# Altium footprint library Elettronica FM.PcbLib: 387 footprints (part 7 of 25)
Each footprint in its own frame and in the unit in brackets; x right, y up, seen from the top. Pads: shape width x height; smd on the part's side, far side on the other; paste and mask are expansions set on the pad; w line width, h text height; cw(c..) or ccw(c..) is an arc to the next point about the centre after c.
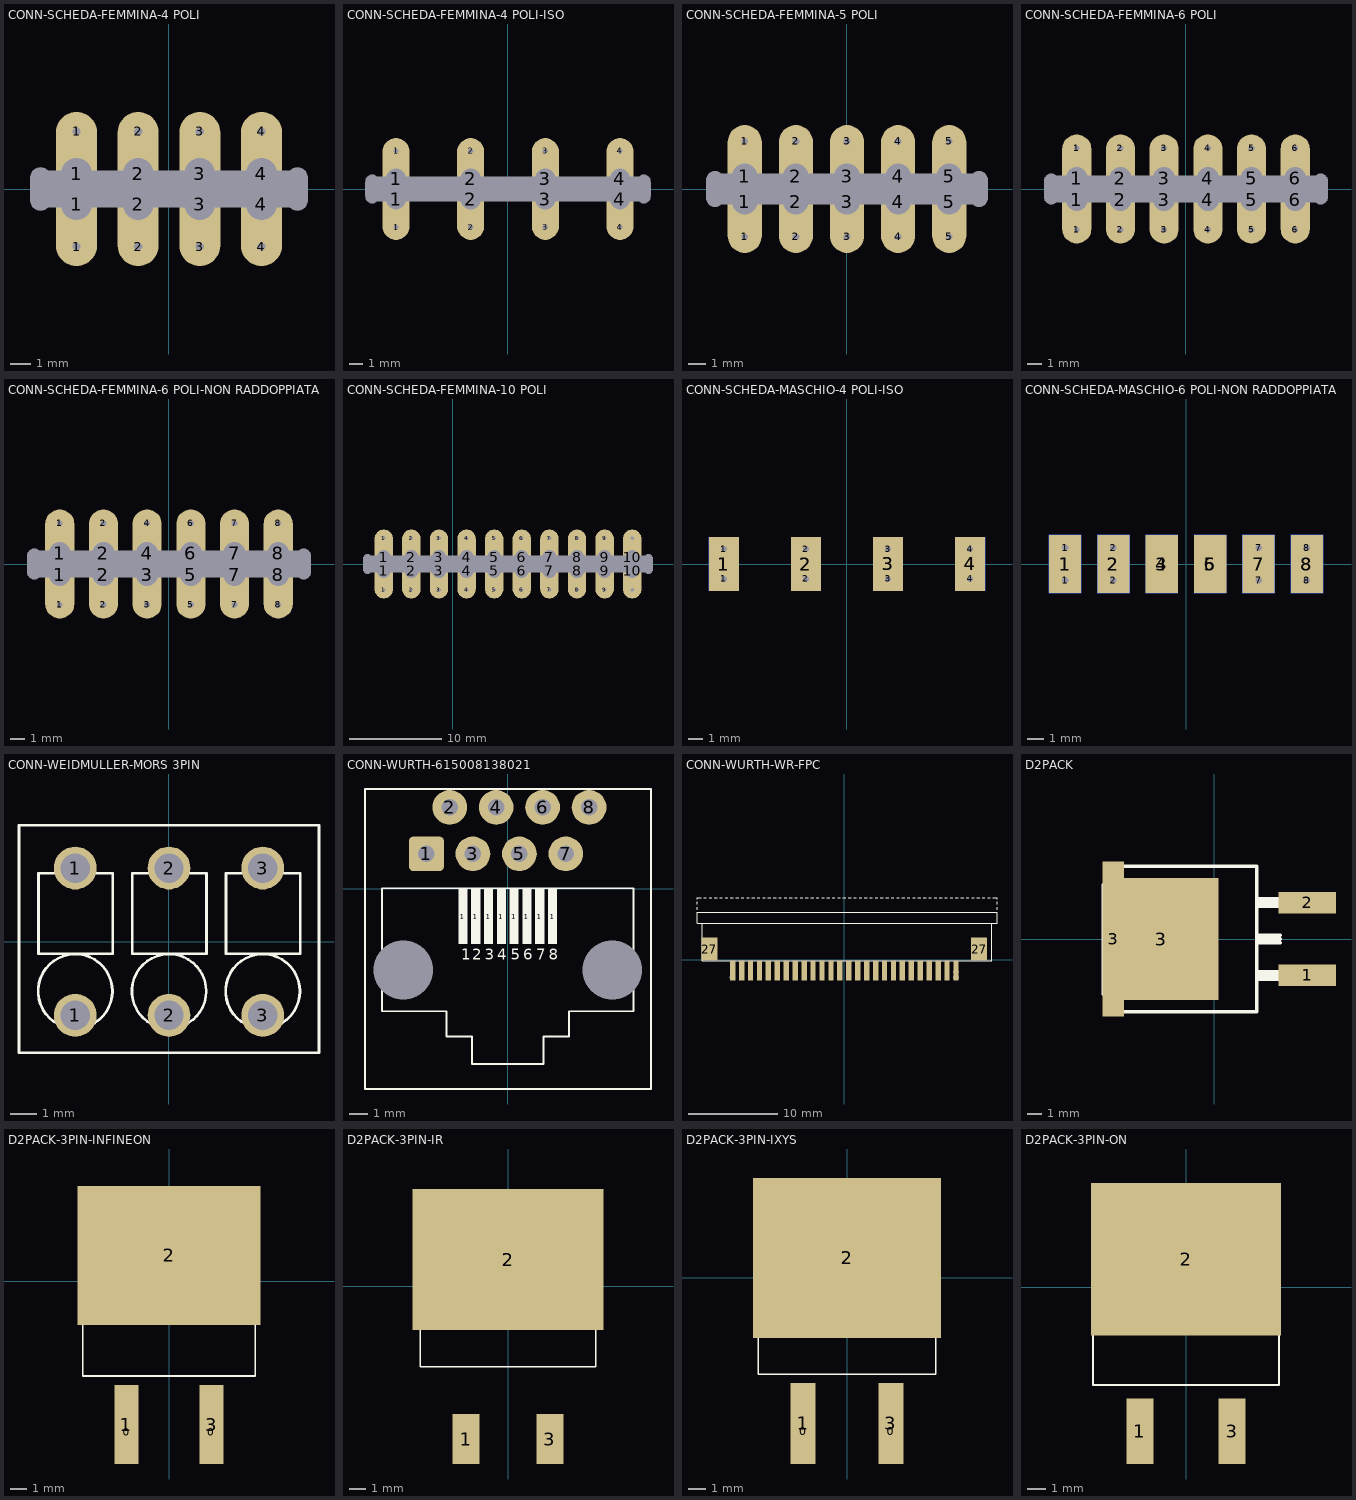
[diagram p6: the footprints below, top view; thin cyan lines are the x and y axes]

## CONN-SCHEDA-FEMMINA-4 POLI [mm]
height 14.2
pads (28):
  round 0 hole 1 slot 2.1 at 90 deg unplated: 0(-6.25,0) 0(6.25,0)
  round 0 hole 1 slot 13.5 at 0 deg unplated: 0(0,-0.4) 0(0,0.4)
  round 0.8 hole 0.4: 1(-4.5,-2.8) 1(-4.5,2.8) 2(-1.5,-2.8) 2(-1.5,2.8) 3(1.5,-2.8) 3(1.5,2.8) 4(4.5,-2.8) 4(4.5,2.8)
  round 0 hole 0.4: 1(-4.5,-2.8) 1(-4.5,2.8) 2(-1.5,-2.8) 2(-1.5,2.8) 3(1.5,-2.8) 3(1.5,2.8) 4(4.5,-2.8) 4(4.5,2.8)
  oval 2x4 hole 1.5 copper offset 0,-1: 1(-4.5,-0.75) 2(-1.5,-0.75) 3(1.5,-0.75) 4(4.5,-0.75)
  oval 2x4 hole 1.5 copper offset 0,1: 1(-4.5,0.75) 2(-1.5,0.75) 3(1.5,0.75) 4(4.5,0.75)

## CONN-SCHEDA-FEMMINA-4 POLI-ISO [mm]
height 14.2
pads (28):
  round 0 hole 1 slot 2.1 at 90 deg unplated: 0(-10,0) 0(10,0)
  round 0 hole 1 slot 21 at 0 deg unplated: 0(0,-0.4) 0(0,0.4)
  round 0 hole 0.4: 1(-8.25,-2.8) 1(-8.25,2.8) 2(-2.75,-2.8) 2(-2.75,2.8) 3(2.75,-2.8) 3(2.75,2.8) 4(8.25,-2.8) 4(8.25,2.8)
  round 0.8 hole 0.4: 1(-8.25,-2.8) 1(-8.25,2.8) 2(-2.75,-2.8) 2(-2.75,2.8) 3(2.75,-2.8) 3(2.75,2.8) 4(8.25,-2.8) 4(8.25,2.8)
  oval 2x4 hole 1.5 copper offset 0,-1: 1(-8.25,-0.75) 2(-2.75,-0.75) 3(2.75,-0.75) 4(8.25,-0.75)
  oval 2x4 hole 1.5 copper offset 0,1: 1(-8.25,0.75) 2(-2.75,0.75) 3(2.75,0.75) 4(8.25,0.75)

## CONN-SCHEDA-FEMMINA-5 POLI [mm]
height 14.2
pads (34):
  round 0 hole 1 slot 2.1 at 90 deg unplated: 0(-7.75,0) 0(7.75,0)
  round 0 hole 1 slot 16.5 at 0 deg unplated: 0(0,-0.4) 0(0,0.4)
  round 0 hole 0.4: 1(-6,-2.8) 1(-6,2.8) 2(-3,-2.8) 2(-3,2.8) 3(0,-2.8) 3(0,2.8) 4(3,-2.8) 4(3,2.8) 5(6,-2.8) 5(6,2.8)
  round 0.8 hole 0.4: 1(-6,-2.8) 1(-6,2.8) 2(-3,-2.8) 2(-3,2.8) 3(0,-2.8) 3(0,2.8) 4(3,-2.8) 4(3,2.8) 5(6,-2.8) 5(6,2.8)
  oval 2x4 hole 1.5 copper offset 0,-1: 1(-6,-0.75) 2(-3,-0.75) 3(0,-0.75) 4(3,-0.75) 5(6,-0.75)
  oval 2x4 hole 1.5 copper offset 0,1: 1(-6,0.75) 2(-3,0.75) 3(0,0.75) 4(3,0.75) 5(6,0.75)

## CONN-SCHEDA-FEMMINA-6 POLI [mm]
height 14.2
pads (40):
  round 0 hole 1 slot 2.1 at 90 deg unplated: 0(-9.25,0) 0(9.25,0)
  round 0 hole 1 slot 19.5 at 0 deg unplated: 0(0,-0.4) 0(0,0.4)
  round 0.8 hole 0.4: 1(-7.5,-2.8) 1(-7.5,2.8) 2(-4.5,-2.8) 2(-4.5,2.8) 3(-1.5,-2.8) 3(-1.5,2.8) 4(1.5,-2.8) 4(1.5,2.8) 5(4.5,-2.8) 5(4.5,2.8) 6(7.5,-2.8) 6(7.5,2.8)
  round 0 hole 0.4: 1(-7.5,-2.8) 1(-7.5,2.8) 2(-4.5,-2.8) 2(-4.5,2.8) 3(-1.5,-2.8) 3(-1.5,2.8) 4(1.5,-2.8) 4(1.5,2.8) 5(4.5,-2.8) 5(4.5,2.8) 6(7.5,-2.8) 6(7.5,2.8)
  oval 2x4 hole 1.5 copper offset 0,-1: 1(-7.5,-0.75) 2(-4.5,-0.75) 3(-1.5,-0.75) 4(1.5,-0.75) 5(4.5,-0.75) 6(7.5,-0.75)
  oval 2x4 hole 1.5 copper offset 0,1: 1(-7.5,0.75) 2(-4.5,0.75) 3(-1.5,0.75) 4(1.5,0.75) 5(4.5,0.75) 6(7.5,0.75)

## CONN-SCHEDA-FEMMINA-6 POLI-NON RADDOPPIATA [mm]
height 14.2
pads (40):
  round 0 hole 1 slot 2.1 at 90 deg unplated: 0(-9.25,0) 0(9.25,0)
  round 0 hole 1 slot 19.5 at 0 deg unplated: 0(0,-0.4) 0(0,0.4)
  round 0 hole 0.4: 1(-7.5,-2.8) 1(-7.5,2.8) 2(-4.5,-2.8) 2(-4.5,2.8) 3(-1.5,-2.8) 4(-1.5,2.8) 5(1.5,-2.8) 6(1.5,2.8) 7(4.5,-2.8) 7(4.5,2.8) 8(7.5,-2.8) 8(7.5,2.8)
  round 0.8 hole 0.4: 1(-7.5,-2.8) 1(-7.5,2.8) 2(-4.5,-2.8) 2(-4.5,2.8) 3(-1.5,-2.8) 4(-1.5,2.8) 5(1.5,-2.8) 6(1.5,2.8) 7(4.5,-2.8) 7(4.5,2.8) 8(7.5,-2.8) 8(7.5,2.8)
  oval 2x4 hole 1.5 copper offset 0,-1: 1(-7.5,-0.75) 2(-4.5,-0.75) 3(-1.5,-0.75) 5(1.5,-0.75) 7(4.5,-0.75) 8(7.5,-0.75)
  oval 2x4 hole 1.5 copper offset 0,1: 1(-7.5,0.75) 2(-4.5,0.75) 4(-1.5,0.75) 6(1.5,0.75) 7(4.5,0.75) 8(7.5,0.75)

## CONN-SCHEDA-FEMMINA-10 POLI [mm]
height 14.2
pads (64):
  round 0 hole 1 slot 2.1 at 90 deg unplated: 0(-9.25,0) 0(21.25,0)
  round 0 hole 1 slot 31.5 at 0 deg unplated: 0(6,-0.4) 0(6,0.4)
  round 0.8 hole 0.4: 1(-7.5,-2.8) 1(-7.5,2.8) 2(-4.5,-2.8) 2(-4.5,2.8) 3(-1.5,-2.8) 3(-1.5,2.8) 4(1.5,-2.8) 4(1.5,2.8) 5(4.5,-2.8) 5(4.5,2.8) 6(7.5,-2.8) 6(7.5,2.8) 7(10.5,-2.8) 7(10.5,2.8) 8(13.5,-2.8) 8(13.5,2.8) 9(16.5,-2.8) 9(16.5,2.8) 10(19.5,-2.8) 10(19.5,2.8)
  round 0 hole 0.4: 1(-7.5,-2.8) 1(-7.5,2.8) 2(-4.5,-2.8) 2(-4.5,2.8) 3(-1.5,-2.8) 3(-1.5,2.8) 4(1.5,-2.8) 4(1.5,2.8) 5(4.5,-2.8) 5(4.5,2.8) 6(7.5,-2.8) 6(7.5,2.8) 7(10.5,-2.8) 7(10.5,2.8) 8(13.5,-2.8) 8(13.5,2.8) 9(16.5,-2.8) 9(16.5,2.8) 10(19.5,-2.8) 10(19.5,2.8)
  oval 2x4 hole 1.5 copper offset 0,-1: 1(-7.5,-0.75) 2(-4.5,-0.75) 3(-1.5,-0.75) 4(1.5,-0.75) 5(4.5,-0.75) 6(7.5,-0.75) 7(10.5,-0.75) 8(13.5,-0.75) 9(16.5,-0.75) 10(19.5,-0.75)
  oval 2x4 hole 1.5 copper offset 0,1: 1(-7.5,0.75) 2(-4.5,0.75) 3(-1.5,0.75) 4(1.5,0.75) 5(4.5,0.75) 6(7.5,0.75) 7(10.5,0.75) 8(13.5,0.75) 9(16.5,0.75) 10(19.5,0.75)

## CONN-SCHEDA-MASCHIO-4 POLI-ISO [mm]
height 14.2
pads (24):
  rect 2x3.6 smd: 1(-8.25,0) 2(-2.75,0) 3(2.75,0) 4(8.25,0)
  rect 2x3.6 smd far side: 1(-8.25,0) 2(-2.75,0) 3(2.75,0) 4(8.25,0)
  round 0.8 hole 0.4: 1(-8.25,-1) 1(-8.25,1) 2(-2.75,-1) 2(-2.75,1) 3(2.75,-1) 3(2.75,1) 4(8.25,-1) 4(8.25,1)
  round 0 hole 0.4: 1(-8.25,-1) 1(-8.25,1) 2(-2.75,-1) 2(-2.75,1) 3(2.75,-1) 3(2.75,1) 4(8.25,-1) 4(8.25,1)

## CONN-SCHEDA-MASCHIO-6 POLI-NON RADDOPPIATA [mm]
height 14.2
pads (28):
  rect 2x3.6 smd: 1(-7.5,0) 2(-4.5,0) 3(-1.5,0) 5(1.5,0) 7(4.5,0) 8(7.5,0)
  rect 2x3.6 smd far side: 1(-7.5,0) 2(-4.5,0) 4(-1.5,0) 6(1.5,0) 7(4.5,0) 8(7.5,0)
  round 0.8 hole 0.4: 1(-7.5,-1) 1(-7.5,1) 2(-4.5,-1) 2(-4.5,1) 7(4.5,-1) 7(4.5,1) 8(7.5,-1) 8(7.5,1)
  round 0 hole 0.4: 1(-7.5,-1) 1(-7.5,1) 2(-4.5,-1) 2(-4.5,1) 7(4.5,-1) 7(4.5,1) 8(7.5,-1) 8(7.5,1)

## CONN-WEIDMULLER-MORS 3PIN [mm]
height 2
pads (6):
  round 1.6 hole 1.1 mask+0.1: 1(-3.5,-2.75) 1(-3.5,2.75) 2(0,-2.75) 2(0,2.75) 3(3.5,-2.75) 3(3.5,2.75)
Top Overlay:
  circle w0.1: c3.5,-1.85 r1.388
  circle w0.1: c0,-1.85 r1.388
  circle w0.1: c-3.5,-1.85 r1.388
  lines w0.1: 5.6,-4.15 -5.6,-4.15 -5.6,4.35 5.6,4.35 5.6,-4.15 ; 5.6,-4.15 5.6,-4.15 ; -4.875,-0.45 -2.1,-0.45 -2.1,2.55 -4.875,2.55 -4.875,-0.45 ; -1.375,-0.45 -1.375,2.55 1.4,2.55 1.4,-0.45 -1.375,-0.45 ; 2.125,-0.45 2.125,2.55 4.9,2.55 4.9,-0.45 2.125,-0.45
3D body "LSF-SMT3.5_3_180 3.5 SW 1825650000.stp": height 13.6, standoff -3.5, extent -5.6,-4.15 5.6,4.35

## CONN-WURTH-615008138021 [mm]
pads (18):
  rrect25% 0x0 hole 3.25 unplated: 0(-5.715,-4.445) 0(5.715,-4.445)
  rrect25% 1.9x1.9 hole 0.9: 1(-4.445,1.905)
  rect 0.5x3 on Top Overlay mask+0.1: 1(-2.45,-1.525) 1(-1.75,-1.525) 1(-1.05,-1.525) 1(-0.35,-1.525) 1(0.35,-1.525) 1(1.05,-1.525) 1(1.75,-1.525) 1(2.45,-1.525)
  round 1.9 hole 0.9: 2(-3.175,4.445) 3(-1.905,1.905) 4(-0.635,4.445) 5(0.635,1.905) 6(1.905,4.445) 7(3.175,1.905) 8(4.445,4.445)
Top Overlay:
  lines w0.1: -7.8,-10.95 -7.8,5.45 7.825,5.45 7.825,-10.95 -7.8,-10.95 ; -6.875,-6.7 -3.35,-6.7 -3.35,-8.075 -1.95,-8.075 -1.95,-9.575 1.95,-9.575 1.95,-8.075 3.35,-8.075 3.35,-6.7 6.875,-6.7 6.875,0.025 -6.875,0.025 -6.875,-6.7
  text "1" at -2.55,-3.875 h0.6
  text "2" at -1.95,-3.875 h0.6
  text "3" at -1.25,-3.875 h0.6
  text "4" at -0.575,-3.875 h0.6
  text "5" at 0.15,-3.875 h0.6
  text "6" at 0.85,-3.875 h0.6
  text "7" at 1.55,-3.875 h0.6
  text "8" at 2.25,-3.875 h0.6
3D body "STEP-615008138021-rev1.stp": height 16.4, standoff -3.5, extent -7.7,-10.85 7.7,5.35

## CONN-WURTH-WR-FPC [mm]
pads (28):
  rect 0.6x2.2 smd mask+0.05: 1(-12.5,-1.2) 2(-11.5,-1.2) 3(-10.5,-1.2) 4(-9.5,-1.2) 5(-8.5,-1.2) 6(-7.5,-1.2) 7(-6.5,-1.2) 8(-5.5,-1.2) 9(-4.5,-1.2) 10(-3.5,-1.2) 11(-2.5,-1.2) 12(-1.5,-1.2) 13(-0.5,-1.2) 14(0.5,-1.2) 15(1.5,-1.2) 16(2.5,-1.2) 17(3.5,-1.2) 18(4.5,-1.2) 19(5.5,-1.2) 20(6.5,-1.2) 21(7.5,-1.2) 22(8.5,-1.2) 23(9.5,-1.2) 24(10.5,-1.2) 25(11.5,-1.2) 26(12.5,-1.2)
  rect 1.8x2.6 smd mask+0.05: 27(-15.1,1.2) 27(15.1,1.2)
Top Overlay:
  lines w0.1: -16.5,5 -16.5,5.3 ; -16.5,5.6 -16.5,5.9 ; -16.5,6.2 -16.5,6.5 ; -16.5,6.8 -16.5,6.95 -16.05,6.95 ; -15.9,4.1 -15.9,-0.1 16.5,-0.1 16.5,4.1 ; -15.75,6.95 -15.45,6.95 ; -15.15,6.95 -14.85,6.95 ; -14.55,6.95 -14.25,6.95 ; -13.95,6.95 -13.65,6.95 ; -13.35,6.95 -13.05,6.95 ; -12.75,6.95 -12.45,6.95 ; -12.15,6.95 -11.85,6.95 ; -11.55,6.95 -11.25,6.95 ; -10.95,6.95 -10.65,6.95 ; -10.35,6.95 -10.05,6.95 ; -9.75,6.95 -9.45,6.95 ; -9.15,6.95 -8.85,6.95 ; -8.55,6.95 -8.25,6.95 ; -7.95,6.95 -7.65,6.95 ; -7.35,6.95 -7.05,6.95 ; -6.75,6.95 -6.45,6.95 ; -6.15,6.95 -5.85,6.95 ; -5.55,6.95 -5.25,6.95 ; -4.95,6.95 -4.65,6.95 ; -4.35,6.95 -4.05,6.95 ; -3.75,6.95 -3.45,6.95 ; -3.15,6.95 -2.85,6.95 ; -2.55,6.95 -2.25,6.95 ; -1.95,6.95 -1.65,6.95 ; -1.35,6.95 -1.05,6.95 ; -0.75,6.95 -0.45,6.95 ; -0.15,6.95 0.15,6.95 ; 0.45,6.95 0.75,6.95 ; 1.05,6.95 1.35,6.95 ; 1.65,6.95 1.95,6.95 ; 2.25,6.95 2.55,6.95 ; 2.85,6.95 3.15,6.95 ; 3.45,6.95 3.75,6.95 ; 4.05,6.95 4.35,6.95 ; 4.65,6.95 4.95,6.95 ; 5.25,6.95 5.55,6.95 ; 5.85,6.95 6.15,6.95 ; 6.45,6.95 6.75,6.95 ; 7.05,6.95 7.35,6.95 ; 7.65,6.95 7.95,6.95 ; 8.25,6.95 8.55,6.95 ; 8.85,6.95 9.15,6.95 ; 9.45,6.95 9.75,6.95 ; 10.05,6.95 10.35,6.95 ; 10.65,6.95 10.95,6.95 ; 11.25,6.95 11.55,6.95 ; 11.85,6.95 12.15,6.95 ; 12.45,6.95 12.75,6.95 ; 13.05,6.95 13.35,6.95 ; 13.65,6.95 13.95,6.95 ; 14.25,6.95 14.55,6.95 ; 14.85,6.95 15.15,6.95 ; 15.45,6.95 15.75,6.95 ; 16.05,6.95 16.35,6.95 ; 16.65,6.95 17.1,6.95 17.1,6.8 ; 17.1,5 17.1,5.3 ; 17.1,5.6 17.1,5.9 ; 17.1,6.2 17.1,6.5 ; -16.5,5.3 17.1,5.3 ; -16.5,5.3 -16.5,4.1 17.1,4.1 17.1,5.3
  text "1" at -12.2,-2.225 h0.6
  text "26" at 12.8,-2.225 h0.6
3D body "68612614422 (rev1).stp": height 3, standoff -0.01, extent -16.5,-1.8 16.5,5.3

## D2PACK [mm]
pads (4):
  rect 4x1.5 smd: 1(6.507,-2.54) 2(6.507,2.54)
  rect 1.5x10.8 smd: 3(-7.05,0)
  rect 8x8.5 smd: 3(-3.7,0)
Top Overlay:
  lines w0.254: -6.462,-5.112 -7.764,-3.81 -7.764,3.747 -6.431,5.08 ; -6.431,-5.112 -6.431,5.08 ; -6.431,-5.08 2.967,-5.08 2.967,5.08 -6.431,5.08 ; 2.967,-2.794 6.015,-2.794 ; 2.967,-2.54 5.253,-2.54 6.015,-2.54 ; 2.967,-2.286 6.015,-2.286 ; 2.967,-0.254 4.618,-0.254 ; 2.967,0 4.618,0 ; 2.967,0.254 4.618,0.254 ; 2.967,2.286 6.142,2.286 ; 2.967,2.54 5.253,2.54 6.142,2.54 ; 2.967,2.794 6.142,2.794
3D body: height 2.2, standoff 0, extent 2.988,-3.1 8.388,-2
3D body: height 2.2, standoff 0, extent 2.988,2 8.388,3.1
3D body: height 1.4, standoff 0, extent -7.812,-5.1 -6.412,5.1
3D body: height 4.85, standoff 0, extent -6.412,-5.1 2.988,5.1

## D2PACK-3PIN-INFINEON [mm]
pads (5):
  rect 0.85x3 on Top Overlay mask+0.1: 0(-2.525,-9) 0(2.525,-9)
  rect 1.45x4.7 smd: 1(-2.54,-8.55) 3(2.54,-8.55)
  rect 10.9x8.3 smd mask-500: 2(0,1.55)
Top Overlay:
  lines w0.1: -5.15,3.8 5.15,3.8 ; -4.3,-2.2 -4.3,-2.5 -4.1,-2.5 ; -4.3,-1.9 -4.3,-1.6 ; -4.3,-1.3 -4.3,-1 ; -4.3,-0.7 -4.3,-0.4 ; -4.3,-0.1 -4.3,0.2 ; -4.3,0.5 -4.3,0.8 ; -4.3,1.1 -4.3,1.4 ; -4.3,1.7 -4.3,2 ; -4.3,2.3 -4.3,2.6 ; -4.3,2.9 -4.3,3.2 ; -4.3,3.5 -4.3,3.8 ; -3.8,-2.5 -3.5,-2.5 ; -3.2,-2.5 -2.9,-2.5 ; -2.6,-2.5 -2.3,-2.5 ; -2,-2.5 -1.7,-2.5 ; -1.4,-2.5 -1.1,-2.5 ; -0.8,-2.5 -0.5,-2.5 ; -0.2,-2.5 0.1,-2.5 ; 0.4,-2.5 0.7,-2.5 ; 1,-2.5 1.3,-2.5 ; 1.6,-2.5 1.9,-2.5 ; 2.2,-2.5 2.5,-2.5 ; 2.8,-2.5 3.1,-2.5 ; 3.4,-2.5 3.7,-2.5 ; 4,-2.5 4.3,-2.5 4.3,-2.2 ; 4.3,-1.9 4.3,-1.6 ; 4.3,-1.3 4.3,-1 ; 4.3,-0.7 4.3,-0.4 ; 4.3,-0.1 4.3,0.2 ; 4.3,0.5 4.3,0.8 ; 4.3,1.1 4.3,1.4 ; 4.3,1.7 4.3,2 ; 4.3,2.3 4.3,2.6 ; 4.3,2.9 4.3,3.2 ; 4.3,3.5 4.3,3.8 ; -5.15,-5.65 -5.15,4.9 -4.65,5.4 4.65,5.4 5.15,4.9 5.15,-5.65 -5.15,-5.65
Top Solder:
  region: -5.45,5.7 5.45,5.7 5.45,3.7 4.4,3.7 4.4,-2.6 -4.4,-2.6 -4.4,3.7 -5.45,3.7
3D body: height 3.25, standoff 2.6, extent 2.095,-8.45 2.955,-5.65
3D body: height 3.25, standoff 0, extent 2.095,-8.45 2.955,-7.8
3D body: height 0.65, standoff 0, extent 2.095,-10.5 2.955,-7.8
3D body: height 0.65, standoff 0, extent -2.955,-10.5 -2.095,-7.8
3D body: height 3.25, standoff 0, extent -2.955,-8.45 -2.095,-7.8
3D body: height 3.25, standoff 2.6, extent -2.955,-8.45 -2.095,-5.65
3D body: height 4.6, standoff 0, extent -5.15,-5.65 5.15,3.8
3D body: height 1.4, standoff 0, extent -5.15,3.8 5.1,5.4

## D2PACK-3PIN-IR [mm]
pads (3):
  rect 1.6x3 smd: 1(-2.525,-9.2) 3(2.525,-9.2)
  rect 11.5x8.5 smd mask-500: 2(0,1.6)
Top Overlay:
  lines w0.1: -5.275,3.95 5.275,3.95 ; -4.45,-2.25 -4.45,-2.55 -4.25,-2.55 -3.95,-2.55 ; -4.45,-1.95 -4.45,-1.65 ; -4.45,-1.35 -4.45,-1.05 ; -4.45,-0.75 -4.45,-0.45 ; -4.45,-0.15 -4.45,0.15 ; -4.45,0.45 -4.45,0.75 ; -4.45,1.05 -4.45,1.35 ; -4.45,1.65 -4.45,1.95 ; -4.45,2.25 -4.45,2.55 ; -4.45,2.85 -4.45,3.15 ; -4.45,3.45 -4.45,3.95 ; -3.65,-2.55 -3.35,-2.55 ; -3.05,-2.55 -2.75,-2.55 ; -2.45,-2.55 -2.15,-2.55 ; -1.85,-2.55 -1.55,-2.55 ; -1.25,-2.55 -0.95,-2.55 ; -0.65,-2.55 -0.35,-2.55 ; -0.05,-2.55 0.25,-2.55 ; 0.55,-2.55 0.85,-2.55 ; 1.15,-2.55 1.45,-2.55 ; 1.75,-2.55 2.05,-2.55 ; 2.35,-2.55 2.65,-2.55 ; 2.95,-2.55 3.25,-2.55 ; 3.55,-2.55 3.85,-2.55 ; 4.15,-2.55 4.45,-2.55 4.45,-2.25 ; 4.45,-1.95 4.45,-1.65 ; 4.45,-1.35 4.45,-1.05 ; 4.45,-0.75 4.45,-0.45 ; 4.45,-0.15 4.45,0.15 ; 4.45,0.45 4.45,0.75 ; 4.45,1.05 4.45,1.35 ; 4.45,1.65 4.45,1.95 ; 4.45,2.25 4.45,2.55 ; 4.45,2.85 4.45,3.15 ; 4.45,3.45 4.45,3.95 ; -5.275,-4.85 -5.275,4.725 -4.65,5.35 4.65,5.35 5.275,4.725 5.275,-4.85 -5.275,-4.85
Top Solder:
  region: -5.75,5.85 5.75,5.85 5.75,3.85 4.55,3.85 4.55,-2.65 -4.55,-2.65 -4.55,3.85 -5.75,3.85
3D body: height 3.05, standoff 2.6, extent -3.225,-6.65 -1.825,-4.85
3D body: height 3.05, standoff 2.6, extent 1.825,-6.65 3.225,-4.85
3D body: height 3.05, standoff 2.6, extent -0.7,-6.65 0.7,-4.85
3D body: height 0.55, standoff 0, extent -3,-10.15 -2.05,-8.25
3D body: height 3.05, standoff 0, extent -3,-8.9 -2.05,-8.25
3D body: height 3.05, standoff 2.6, extent -3,-8.9 -2.05,-4.85
3D body: height 4.7, standoff 0, extent -5.275,-4.85 5.275,3.95
3D body: height 1.4, standoff 0, extent -5.275,3.95 5.275,5.35
3D body: height 3.05, standoff 2.6, extent 2.05,-8.9 3,-4.85
3D body: height 3.05, standoff 0, extent 2.05,-8.9 3,-8.25
3D body: height 0.55, standoff 0, extent 2.05,-10.15 3,-8.25

## D2PACK-3PIN-IXYS [mm]
pads (5):
  rect 0.85x3 on Top Overlay mask+0.1: 0(-2.525,-8.9) 0(2.525,-8.9)
  rect 1.45x4.7 smd: 1(-2.54,-8.45) 3(2.54,-8.45)
  rect 10.9x9.3 smd mask-500: 2(0,1.15)
Top Overlay:
  lines w0.1: -5.15,3.8 5.15,3.8 ; -4.25,-3.1 -4.25,-3.4 -4.15,-3.4 ; -4.25,-2.8 -4.25,-2.5 ; -4.25,-2.2 -4.25,-1.9 ; -4.25,-1.6 -4.25,-1.3 ; -4.25,-1 -4.25,-0.7 ; -4.25,-0.4 -4.25,-0.1 ; -4.25,0.2 -4.25,0.5 ; -4.25,0.8 -4.25,1.1 ; -4.25,1.4 -4.25,1.7 ; -4.25,2 -4.25,2.3 ; -4.25,2.6 -4.25,2.9 ; -4.25,3.2 -4.25,3.5 ; -4.25,3.725 -4.25,3.8 ; -3.85,-3.4 -3.55,-3.4 ; -3.25,-3.4 -2.95,-3.4 ; -2.65,-3.4 -2.35,-3.4 ; -2.05,-3.4 -1.75,-3.4 ; -1.45,-3.4 -1.15,-3.4 ; -0.85,-3.4 -0.55,-3.4 ; -0.25,-3.4 0.05,-3.4 ; 0.35,-3.4 0.65,-3.4 ; 0.95,-3.4 1.25,-3.4 ; 1.55,-3.4 1.85,-3.4 ; 2.15,-3.4 2.45,-3.4 ; 2.75,-3.4 3.05,-3.4 ; 3.35,-3.4 3.65,-3.4 ; 3.95,-3.4 4.25,-3.4 4.25,-3.1 ; 4.25,-2.8 4.25,-2.5 ; 4.25,-2.2 4.25,-1.9 ; 4.25,-1.6 4.25,-1.3 ; 4.25,-1 4.25,-0.7 ; 4.25,-0.4 4.25,-0.1 ; 4.25,0.2 4.25,0.5 ; 4.25,0.8 4.25,1.1 ; 4.25,1.4 4.25,1.7 ; 4.25,2 4.25,2.3 ; 4.25,2.6 4.25,2.9 ; 4.25,3.2 4.25,3.5 ; 4.25,3.725 4.25,3.8 ; -5.15,-5.6 -5.15,4.9 -4.55,5.5 4.55,5.5 5.15,4.9 5.15,-5.6 -5.15,-5.6
Top Solder:
  region: -5.45,5.8 5.45,5.8 5.45,3.7 4.35,3.7 4.35,-3.5 -4.35,-3.5 -4.35,3.7 -5.45,3.7
3D body: height 3.25, standoff 2.6, extent 2.095,-8.45 2.955,-5.65
3D body: height 3.25, standoff 0, extent 2.095,-8.45 2.955,-7.8
3D body: height 0.65, standoff 0, extent 2.095,-10.5 2.955,-7.8
3D body: height 0.65, standoff 0, extent -2.955,-10.5 -2.095,-7.8
3D body: height 3.25, standoff 0, extent -2.955,-8.45 -2.095,-7.8
3D body: height 3.25, standoff 2.6, extent -2.955,-8.45 -2.095,-5.65
3D body: height 4.6, standoff 0, extent -5.15,-5.6 5.15,3.8
3D body: height 1.4, standoff 0, extent -5.15,3.8 5.1,5.4

## D2PACK-3PIN-ON [mm]
pads (3):
  rect 1.5x3.6 smd: 1(-2.54,-7.95) 3(2.54,-7.95)
  rect 10.5x8.4 smd mask-500: 2(0,1.55)
Top Overlay:
  lines w0.1: -5.125,3.95 5.125,3.95 ; -4.125,-0.8 -4.125,-1.1 -3.925,-1.1 ; -4.125,-0.5 -4.125,-0.2 ; -4.125,0.1 -4.125,0.4 ; -4.125,0.7 -4.125,1 ; -4.125,1.3 -4.125,1.6 ; -4.125,1.9 -4.125,2.2 ; -4.125,2.5 -4.125,2.8 ; -4.125,3.1 -4.125,3.4 ; -4.125,3.7 -4.125,3.95 ; -3.75,-1.1 -3.45,-1.1 ; -3.15,-1.1 -2.85,-1.1 ; -2.55,-1.1 -2.25,-1.1 ; -1.95,-1.1 -1.65,-1.1 ; -1.35,-1.1 -1.05,-1.1 ; -0.75,-1.1 -0.45,-1.1 ; -0.15,-1.1 0.15,-1.1 ; 0.45,-1.1 0.75,-1.1 ; 1.05,-1.1 1.35,-1.1 ; 1.65,-1.1 1.95,-1.1 ; 2.25,-1.1 2.55,-1.1 ; 2.85,-1.1 3.15,-1.1 ; 3.45,-1.1 3.75,-1.1 ; 3.925,-1.1 4.125,-1.1 4.125,-0.8 ; 4.125,-0.5 4.125,-0.2 ; 4.125,0.1 4.125,0.4 ; 4.125,0.7 4.125,1 ; 4.125,1.3 4.125,1.6 ; 4.125,1.9 4.125,2.2 ; 4.125,2.5 4.125,2.8 ; 4.125,3.1 4.125,3.4 ; 4.125,3.7 4.125,3.95 ; -5.125,-5.4 -5.125,4.775 -4.65,5.25 4.65,5.25 5.125,4.775 5.125,-5.4 -5.125,-5.4
Top Solder:
  region: -5.25,5.75 5.25,5.75 5.25,3.85 4.225,3.85 4.225,-1.2 -4.225,-1.2 -4.225,3.85 -5.25,3.85
3D body: height 0.55, standoff 0, extent -3,-9.45 -2.1,-6.45
3D body: height 3.05, standoff 0, extent -3,-7.1 -2.1,-6.45
3D body: height 3.05, standoff 2.6, extent -3,-7.1 -2.1,-5.4
3D body: height 4.7, standoff 0, extent -5.125,-5.4 5.125,3.95
3D body: height 1.4, standoff 0, extent -5.125,3.95 5.125,5.25
3D body: height 3.05, standoff 2.6, extent 2.1,-7.1 3,-5.4
3D body: height 3.05, standoff 0, extent 2.1,-7.1 3,-6.45
3D body: height 0.55, standoff 0, extent 2.1,-9.45 3,-6.45